# Altium footprint library DIP Switch.PcbLib: 31 footprints (part 1 of 2)
Each footprint in its own frame and in the unit in brackets; x right, y up, seen from the top. Pads: shape width x height; smd on the part's side, far side on the other; paste and mask are expansions set on the pad; w line width, h text height; cw(c..) or ccw(c..) is an arc to the next point about the centre after c.
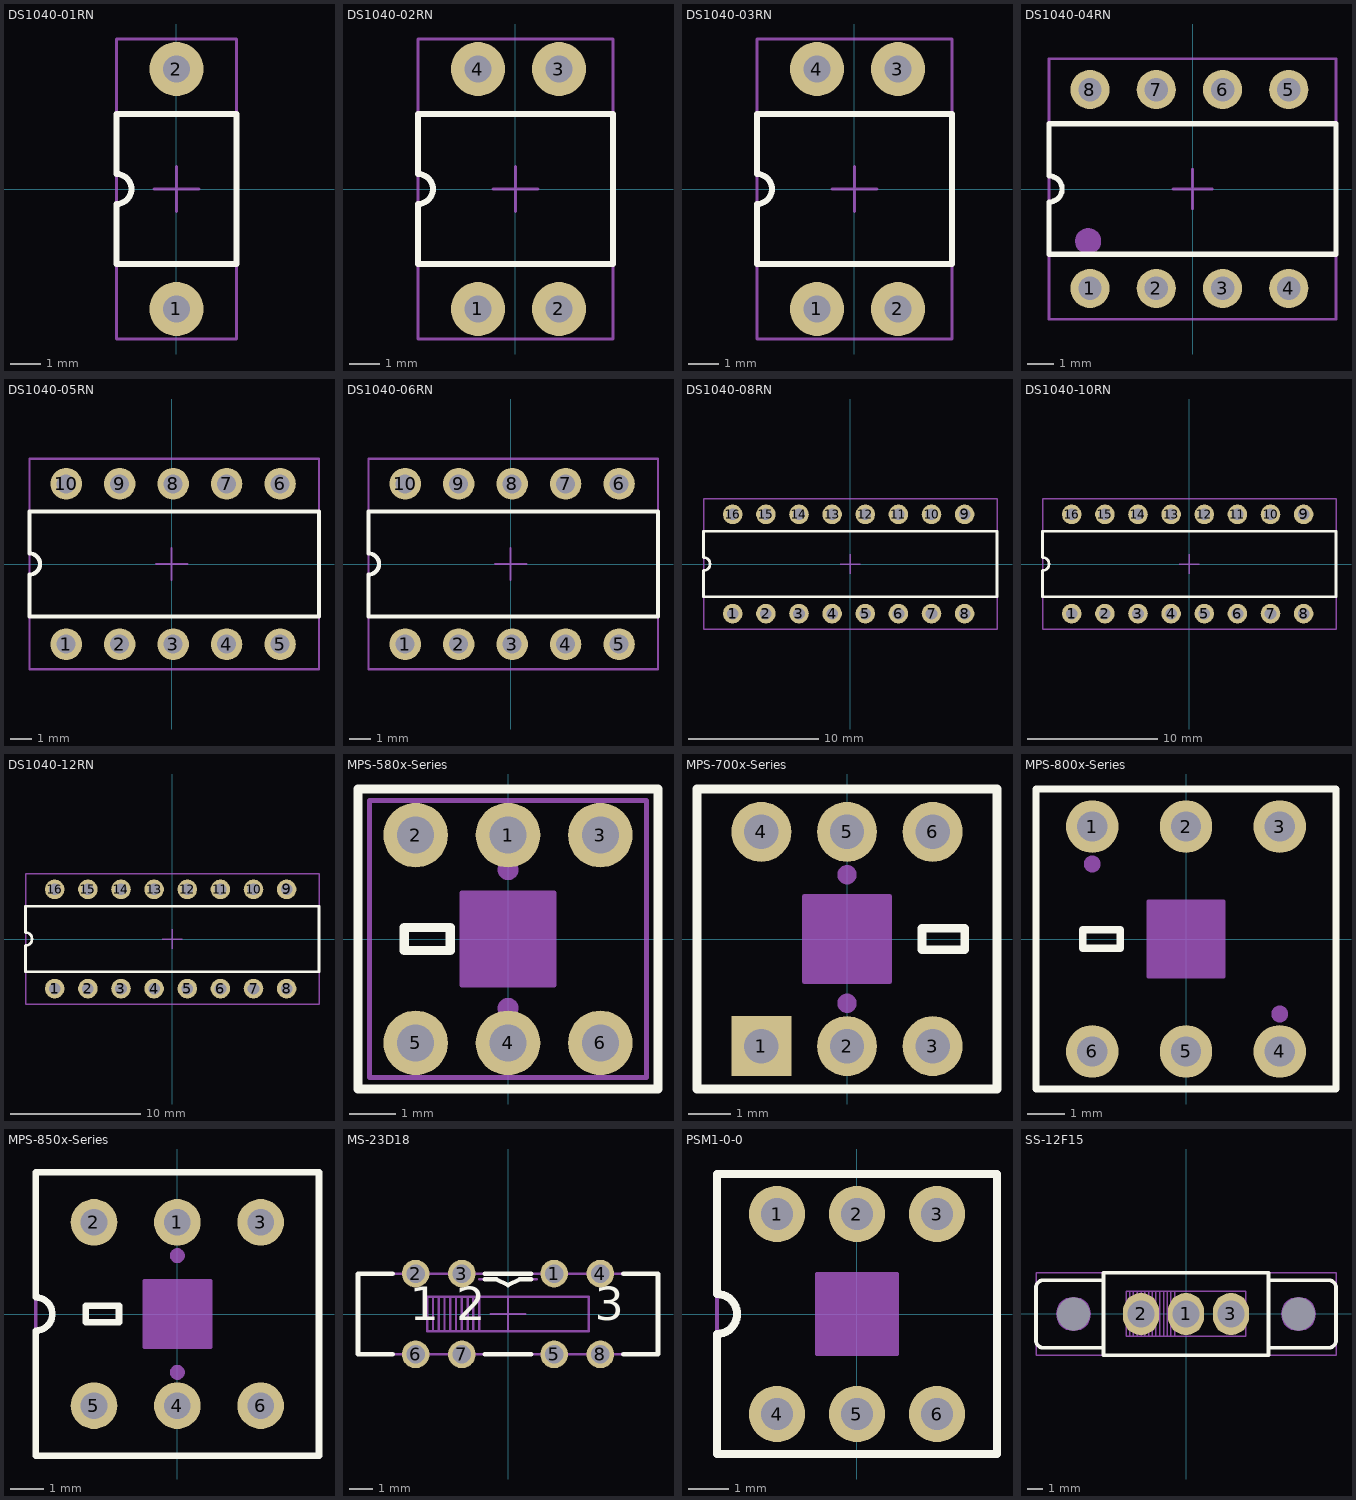
[diagram p0: the footprints below, top view; thin cyan lines are the x and y axes]

## DS1040-01RN [mm]
height 8
pads (2):
  round 1.8 hole 0.9: 1(0,-4) 2(0,4)
Top Overlay:
  lines w0.2: -2,-2.5 -2,-0.5 ccw(c-2,0) -2,0.5 -2,2.5 2,2.5 2,-2.5 -2,-2.5
Mechanical 15:
  lines w0.1: -0.75,0 0.75,0 ; 0,-0.75 0,0.75 ; -2,-5 2,-5 2,5 -2,5 -2,-5

## DS1040-02RN [mm]
height 8
pads (4):
  round 1.8 hole 0.9: 1(-1.25,-4) 2(1.45,-4) 3(1.45,4) 4(-1.25,4)
Top Overlay:
  lines w0.2: -3.25,-2.5 3.25,-2.5 3.25,2.5 -3.25,2.5 -3.25,0.5 cw(c-3.25,0) -3.25,-0.5 -3.25,-2.5
Mechanical 15:
  lines w0.1: -0.75,0 0.75,0 ; 0,-0.75 0,0.75 ; -3.25,-5 -3.25,5 3.25,5 3.25,-5 -3.25,-5
3D body: height 7.9, standoff -2.2, extent -3.25,-5.08 3.35,5.08

## DS1040-03RN [mm]
height 8
pads (4):
  round 1.8 hole 0.9: 1(-1.25,-4) 2(1.45,-4) 3(1.45,4) 4(-1.25,4)
Top Overlay:
  lines w0.2: -3.25,-2.5 -3.25,-0.5 ccw(c-3.25,0) -3.25,0.5 -3.25,2.5 3.25,2.5 3.25,-2.5 -3.25,-2.5
Mechanical 13:
  text "Not Ready!" at -4.5,-0.5 h3
Mechanical 15:
  lines w0.1: -0.75,0 0.75,0 ; 0,-0.75 0,0.75 ; -3.25,-5 3.25,-5 3.25,5 -3.25,5 -3.25,-5
3D body: height 8.9, standoff -1.2, extent -3.25,-5.08 5.89,5.08

## DS1040-04RN [mm]
height 8
pads (8):
  round 1.5 hole 0.9: 1(-3.93,-3.81) 2(-1.39,-3.81) 3(1.15,-3.81) 4(3.69,-3.81) 5(3.69,3.81) 6(1.15,3.81) 7(-1.39,3.81) 8(-3.93,3.81)
Top Overlay:
  lines w0.2: -5.5,-2.5 5.5,-2.5 5.5,2.5 -5.5,2.5 -5.5,0.5 cw(c-5.5,0) -5.5,-0.5 -5.5,-2.5
Mechanical 13:
  circle w0.5: c-4,-2 r0.25
  lines w0.1: -5.5,-5 -5.5,5 5.5,5 5.5,-5 -5.5,-5
Mechanical 15:
  lines w0.1: -0.75,0 0.75,0 ; 0,-0.75 0,0.75 ; -5.5,-5 5.5,-5 5.5,5 -5.5,5 -5.5,-5
3D body: height 8, standoff -2.7, extent -5.66,-4.9 5.5,5

## DS1040-05RN [mm]
height 8
pads (10):
  round 1.5 hole 0.9: 1(-5.01,-3.81) 2(-2.47,-3.81) 3(0.07,-3.81) 4(2.61,-3.81) 5(5.15,-3.81) 6(5.15,3.81) 7(2.61,3.81) 8(0.07,3.81) 9(-2.47,3.81) 10(-5.01,3.81)
Top Overlay:
  lines w0.2: -6.75,-2.5 7,-2.5 7,2.5 -6.75,2.5 -6.75,0.5 cw(c-6.75,0) -6.75,-0.5 -6.75,-2.5
Mechanical 15:
  lines w0.1: -0.75,0 0.75,0 ; 0,-0.75 0,0.75 ; -6.75,-5 -6.75,5 7,5 7,-5 -6.75,-5
3D body: height 9, standoff -1.7, extent -6.75,-4.95 6.95,4.95

## DS1040-06RN [mm]
height 8
pads (10):
  round 1.5 hole 0.9: 1(-5.01,-3.81) 2(-2.47,-3.81) 3(0.07,-3.81) 4(2.61,-3.81) 5(5.15,-3.81) 6(5.15,3.81) 7(2.61,3.81) 8(0.07,3.81) 9(-2.47,3.81) 10(-5.01,3.81)
Top Overlay:
  lines w0.2: -6.75,-2.5 -6.75,-0.5 ccw(c-6.75,0) -6.75,0.5 -6.75,2.5 7,2.5 7,-2.5 -6.75,-2.5
Mechanical 13:
  text "Not Ready!" at -4.5,-0.5 h3
Mechanical 15:
  lines w0.1: -0.75,0 0.75,0 ; 0,-0.75 0,0.75 ; -6.75,-5 7,-5 7,5 -6.75,5 -6.75,-5
3D body: height 8.9, standoff -1.2, extent -4.98,-3.81 11.78,6.35

## DS1040-08RN [mm]
height 8
pads (16):
  round 1.5 hole 0.9: 1(-9.01,-3.81) 2(-6.47,-3.81) 3(-3.93,-3.81) 4(-1.39,-3.81) 5(1.15,-3.81) 6(3.69,-3.81) 7(6.23,-3.81) 8(8.77,-3.81) 9(8.77,3.81) 10(6.23,3.81) 11(3.69,3.81) 12(1.15,3.81) 13(-1.39,3.81) 14(-3.93,3.81) 15(-6.47,3.81) 16(-9.01,3.81)
Top Overlay:
  lines w0.2: -11.25,-2.5 11.25,-2.5 11.25,2.5 -11.25,2.5 -11.25,0.5 cw(c-11.25,0) -11.25,-0.5 -11.25,-2.5
Mechanical 15:
  lines w0.1: -0.75,0 0.75,0 ; 0,-0.75 0,0.75 ; -11.25,-5 -11.25,5 11.25,5 11.25,-5 -11.25,-5
3D body: height 10.25, standoff -1.5, extent -11.25,-4.89 11.25,4.89

## DS1040-10RN [mm]
height 8
pads (16):
  round 1.5 hole 0.9: 1(-9.01,-3.81) 2(-6.47,-3.81) 3(-3.93,-3.81) 4(-1.39,-3.81) 5(1.15,-3.81) 6(3.69,-3.81) 7(6.23,-3.81) 8(8.77,-3.81) 9(8.77,3.81) 10(6.23,3.81) 11(3.69,3.81) 12(1.15,3.81) 13(-1.39,3.81) 14(-3.93,3.81) 15(-6.47,3.81) 16(-9.01,3.81)
Top Overlay:
  lines w0.2: -11.25,-2.5 -11.25,-0.5 ccw(c-11.25,0) -11.25,0.5 -11.25,2.5 11.25,2.5 11.25,-2.5 -11.25,-2.5
Mechanical 13:
  text "Not Ready!" at -4.5,-0.5 h3
Mechanical 15:
  lines w0.1: -0.75,0 0.75,0 ; 0,-0.75 0,0.75 ; -11.25,-5 11.25,-5 11.25,5 -11.25,5 -11.25,-5
3D body: height 10.25, standoff -1.5, extent -11.25,-4.89 16.33,4.89

## DS1040-12RN [mm]
height 8
pads (16):
  round 1.5 hole 0.9: 1(-9.01,-3.81) 2(-6.47,-3.81) 3(-3.93,-3.81) 4(-1.39,-3.81) 5(1.15,-3.81) 6(3.69,-3.81) 7(6.23,-3.81) 8(8.77,-3.81) 9(8.77,3.81) 10(6.23,3.81) 11(3.69,3.81) 12(1.15,3.81) 13(-1.39,3.81) 14(-3.93,3.81) 15(-6.47,3.81) 16(-9.01,3.81)
Top Overlay:
  lines w0.2: -11.25,-2.5 11.25,-2.5 11.25,2.5 -11.25,2.5 -11.25,0.5 cw(c-11.25,0) -11.25,-0.5 -11.25,-2.5
Mechanical 13:
  text "Not Ready!" at -4.5,-0.5 h3
Mechanical 15:
  lines w0.1: -0.75,0 0.75,0 ; 0,-0.75 0,0.75 ; -11.25,-5 -11.25,5 11.25,5 11.25,-5 -11.25,-5
3D body: height 10.25, standoff -1.5, extent -16.33,-4.89 16.33,4.89

## MPS-580x-Series [mm]
height 10
pads (6):
  round 1.4 hole 0.8: 1(0,2.25) 2(-2,2.25) 3(2,2.25) 4(0,-2.25) 5(-2,-2.25) 6(2,-2.25)
Top Overlay:
  lines w0.2: -3.25,-3.25 -3.25,3.25 3.25,3.25 3.25,-3.25 -3.25,-3.25 ; -2.25,-0.25 -1.25,-0.25 -1.25,0.25 -2.25,0.25 -2.25,-0.25
Mechanical 13:
  circle w0.25: c0,1.5 r0.1
  circle w0.25: c0,-1.5 r0.1
  rectangle: -1,-1 1,1
  lines w0.1: -3,-3 -3,3 3,3 3,-3 -3,-3 ; -1,-1 -1,1 1,1 1,-1 -1,-1
  text "Check!" at -3.5,3.75 h1.52
Mechanical 15:
  lines w0.1: -0.75,0 0.75,0 ; 0,-0.75 0,0.75 ; -3.25,-3.25 -3.25,3.25 3.25,3.25 3.25,-3.25 -3.25,-3.25
3D body: height 12.3, standoff -2.5, extent -4,-4 4,4

## MPS-700x-Series [mm] "PSW-3"
height 12.5
pads (6):
  rect 1.4x1.4 hole 0.8: 1(-2,-2.5)
  round 1.4 hole 0.8: 2(0,-2.5) 3(2,-2.5) 4(-2,2.5) 5(0,2.5) 6(2,2.5)
Top Overlay:
  lines w0.2: -3.5,-3.5 -3.5,3.5 3.5,3.5 3.5,-3.5 -3.5,-3.5 ; 1.75,-0.25 2.75,-0.25 2.75,0.25 1.75,0.25 1.75,-0.25
Mechanical 13:
  circle w0.25: c0,1.5 r0.1
  circle w0.25: c0,-1.5 r0.1
  rectangle: -1,-1 1,1
  lines w0.1: -3.5,-3.5 -3.5,3.5 3.5,3.5 3.5,-3.5 -3.5,-3.5 ; -1,-1 -1,1 1,1 1,-1 -1,-1
Mechanical 15:
  lines w0.1: -0.75,0 0.75,0 ; 0,-0.75 0,0.75 ; -3.5,-3.5 -3.5,3.5 3.5,3.5 3.5,-3.5 -3.5,-3.5
3D body: height 13.2, standoff -2.7, extent -3.5,-3.5 3.5,3.5

## MPS-800x-Series [mm] "PSW-1"
height 13.5
pads (6):
  round 1.4 hole 0.8: 1(-2.5,3) 2(0,3) 3(2.5,3) 4(2.5,-3) 5(0,-3) 6(-2.5,-3)
Top Overlay:
  lines w0.2: -4,-4 4,-4 4,4 -4,4 -4,-4 ; -2.75,-0.25 -2.75,0.25 -1.75,0.25 -1.75,-0.25 -2.75,-0.25
Mechanical 13:
  circle w0.25: c-2.5,2 r0.1
  circle w0.25: c2.5,-2 r0.1
  rectangle: -1,-1 1,1
  lines w0.1: -4,-4 4,-4 4,4 -4,4 -4,-4 ; -1,-1 1,-1 1,1 -1,1 -1,-1
  text "Check!" at -4,4.5 h1.52
Mechanical 15:
  lines w0.1: -0.75,0 0.75,0 ; 0,-0.75 0,0.75 ; -4,-4 4,-4 4,4 -4,4 -4,-4
3D body: height 13.2, standoff -2.7, extent -3.5,-3.5 3.5,3.5

## MPS-850x-Series [mm] "PSW-2"
height 14
pads (6):
  round 1.4 hole 0.8: 1(0,2.75) 2(-2.5,2.75) 3(2.5,2.75) 4(0,-2.75) 5(-2.5,-2.75) 6(2.5,-2.75)
Top Overlay:
  lines w0.2: -4.25,-4.25 -4.25,-0.5 ccw(c-4.25,0) -4.25,0.5 -4.25,4.25 4.25,4.25 4.25,-4.25 -4.25,-4.25 ; -2.75,-0.25 -1.75,-0.25 -1.75,0.25 -2.75,0.25 -2.75,-0.25
Mechanical 13:
  circle w0.25: c0,-1.75 r0.1
  circle w0.25: c0,1.75 r0.1
  rectangle: -1,-1 1,1
  lines w0.1: -4.25,-4.25 -4.25,4.25 4.25,4.25 4.25,-4.25 -4.25,-4.25 ; -1,-1 -1,1 1,1 1,-1 -1,-1
  text "Check!" at -3.75,4.75 h1.52
Mechanical 15:
  lines w0.1: -0.75,0 0.75,0 ; 0,-0.75 0,0.75 ; -4.25,-4.25 -4.25,4.25 4.25,4.25 4.25,-4.25 -4.25,-4.25
3D body: height 13.2, standoff -2.7, extent -3.5,-3.5 3.5,3.5

## MS-23D18 [mm]
height 5.5
pads (8):
  round 1.2 hole 0.8: 1(2,1.75) 2(-4,1.75) 3(-2,1.75) 4(4,1.75) 5(2,-1.75) 6(-4,-1.75) 7(-2,-1.75) 8(4,-1.75)
Top Overlay:
  lines w0.2: -5,-1.75 -6.5,-1.75 -6.5,1.75 -5,1.75 ; -1,-1.75 1,-1.75 ; -1,1.5 -0.5,1.5 0,1.25 0.5,1.5 1,1.5 ; -1,1.75 1,1.75 ; 5,-1.75 6.5,-1.75 6.5,1.75 5,1.75
  text "3" at 3.75,-0.75 h2.5
  text "2" at -2.25,-0.75 h2.5
  text "1" at -4.25,-0.75 h2.5
Mechanical 13:
  lines w0.1: -3.25,-0.75 -3.25,0.75 ; -3,-0.75 -3,0.75 ; -2.75,-0.75 -2.75,0.75 ; -2.5,-0.75 -2.5,0.75 ; -2.25,-0.75 -2.25,0.75 ; -2,-0.75 -2,0.75 ; -1.75,-0.75 -1.75,0.75 ; -1.5,-0.75 -1.5,0.75 ; -1.25,-0.75 -1.25,0.75 ; -1.25,1.5 -0.5,1.5 0,1.25 0.5,1.5 1.25,1.5 ; -6.5,-1.75 6.5,-1.75 6.5,1.75 -6.5,1.75 -6.5,-1.75 ; -3.5,-0.75 -3.5,0.75 3.5,0.75 3.5,-0.75 -3.5,-0.75
Mechanical 15:
  lines w0.1: -0.75,0 0.75,0 ; 0,-0.75 0,0.75 ; -6.5,-1.75 -6.5,1.75 6.5,1.75 6.5,-1.75 -6.5,-1.75

## PSM1-0-0 [mm]
pads (6):
  round 1.4 hole 0.8: 1(-2,2.5) 2(0,2.5) 3(2,2.5) 4(-2,-2.5) 5(0,-2.5) 6(2,-2.5)
Top Overlay:
  lines w0.2: -3.5,-3.5 -3.5,-0.5 ccw(c-3.5,0) -3.5,0.5 -3.5,3.5 3.5,3.5 3.5,-3.5 -3.5,-3.5
Mechanical 13:
  rectangle: -1,-1 1,1
  lines w0.1: -3.5,-3.5 3.5,-3.5 3.5,3.5 -3.5,3.5 -3.5,-3.5 ; -1,-1 1,-1 1,1 -1,1 -1,-1
  text "CHECK!" at 2.75,-0.75 h1.52
Mechanical 15:
  lines w0.1: -0.75,0 0.75,0 ; 0,-0.75 0,0.75 ; -3.5,-3.5 3.5,-3.5 3.5,3.5 -3.5,3.5 -3.5,-3.5
3D body: height 14, standoff -3, extent 3.75,-4.25 11.75,3.75

## SS-12F15 [mm]
height 11
pads (5):
  round 0 hole 2.2: 0(-7.5,0) 0(7.5,0)
  oval 2.4x2.8 hole 1.8: 1(0,0) 2(-3,0) 3(3,0)
Top Overlay:
  lines w0.25: -5.5,-2.25 -9.5,-2.25 cw(c-9.5,-1.75) -10,-1.75 -10,1.75 cw(c-9.5,1.75) -9.5,2.25 -5.5,2.25 ; 5.5,-2.25 9.5,-2.25 ccw(c9.5,-1.75) 10,-1.75 10,1.75 ccw(c9.5,1.75) 9.5,2.25 5.5,2.25 ; -5.5,-2.75 -5.5,2.75 5.5,2.75 5.5,-2.75 -5.5,-2.75
Mechanical 13:
  circle w0.1: c-7.5,0 r1.1
  circle w0.1: c-7.5,0 r1.1
  circle w0.1: c7.5,0 r1.1
  lines w0.1: -5.5,-2.25 -9.5,-2.25 cw(c-9.5,-1.75) -10,-1.75 -10,1.75 cw(c-9.5,1.75) -9.5,2.25 -5.5,2.25 ; -3.75,-1.5 -3.75,1.5 ; -3.5,-1.5 -3.5,1.5 ; -3.25,-1.5 -3.25,1.5 ; -3,-1.5 -3,1.5 ; -2.75,-1.5 -2.75,1.5 ; -2.5,-1.5 -2.5,1.5 ; -2.25,-1.5 -2.25,1.5 ; -2,-1.5 -2,1.5 ; -1.75,-1.5 -1.75,1.5 ; -1.5,-1.5 -1.5,1.5 ; -1.25,-1.5 -1.25,1.5 ; -1,-1.5 -1,1.5 ; -0.75,-1.5 -0.75,1.5 ; 5.5,-2.25 9.5,-2.25 ccw(c9.5,-1.75) 10,-1.75 10,1.75 ccw(c9.5,1.75) 9.5,2.25 5.5,2.25 ; -5.5,-2.75 5.5,-2.75 5.5,2.75 -5.5,2.75 -5.5,-2.75 ; -4,-1.5 -4,1.5 4,1.5 4,-1.5 -4,-1.5
Mechanical 15:
  circle w0.1: c7.5,0 r1.1
  circle w0.1: c-7.5,0 r1.1
  lines w0.1: -0.75,0 0.75,0 ; 0,-0.75 0,0.75 ; -10,-2.75 10,-2.75 10,2.75 -10,2.75 -10,-2.75
3D body: height 9.65, standoff -2.6, extent -7,-3.1 7,3.1